# Altium footprint library TarabusLibrary.PcbLib: 591 footprints (part 23 of 37)
Each footprint in its own frame and in the unit in brackets; x right, y up, seen from the top. Pads: shape width x height; smd on the part's side, far side on the other; paste and mask are expansions set on the pad; w line width, h text height; cw(c..) or ccw(c..) is an arc to the next point about the centre after c.
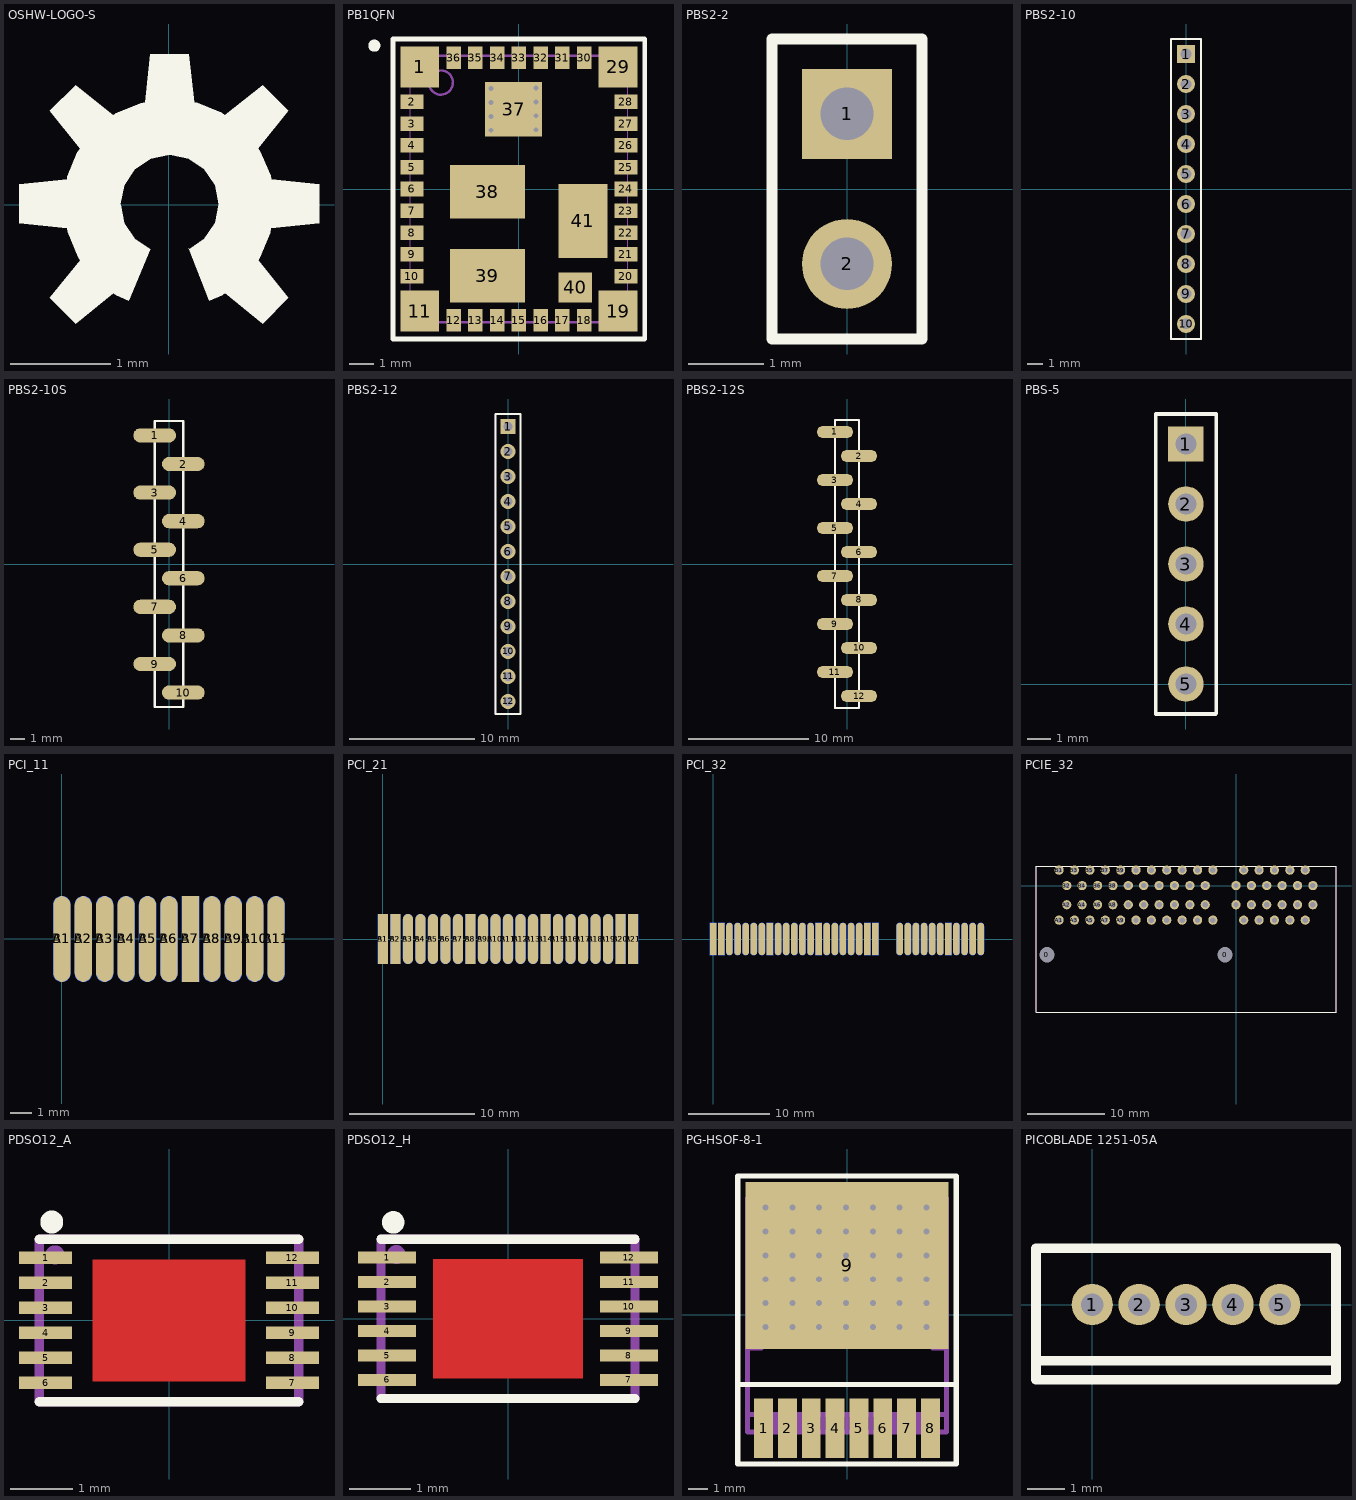
[diagram p22: the footprints below, top view; thin cyan lines are the x and y axes]

## OSHW-LOGO-S [mm] "OSHW-LOGO-S"
Top Overlay:
  region: 0.406,-0.953 0.534,-0.9 0.561,-0.879 0.559,-0.875 0.94,-1.182 1.194,-0.924 0.894,-0.549 0.91,-0.528 1.014,-0.278 1.02,-0.233 1.016,-0.232 1.499,-0.183 1.499,0.203 1.021,0.255 1.016,0.288 0.916,0.531 0.893,0.561 0.889,0.559 1.194,0.94 0.94,1.194 0.561,0.893 0.531,0.916 0.288,1.016 0.255,1.021 0.254,1.016 0.203,1.499 -0.183,1.499 -0.233,1.02 -0.278,1.014 -0.528,0.91 -0.549,0.894 -0.546,0.889 -0.924,1.194 -1.182,0.94 -0.878,0.561 -0.906,0.523 -1.007,0.279 -1.011,0.255 -1.005,0.254 -1.489,0.203 -1.489,-0.183 -1.01,-0.233 -1.005,-0.269 -0.901,-0.52 -0.879,-0.549 -0.875,-0.546 -1.182,-0.924 -0.924,-1.182 -0.549,-0.879 -0.52,-0.901 -0.395,-0.953 -0.183,-0.442 -0.338,-0.338 -0.442,-0.183 -0.478,0 -0.477,0 -0.478,0.008 -0.441,0.195 -0.335,0.354 -0.176,0.461 0.012,0.498 0.199,0.461 0.358,0.354 0.465,0.195 0.502,0.008 0.465,-0.18 0.358,-0.339 0.206,-0.44 0.203,-0.433

## PB1QFN [mm]
height 2.9
pads (41):
  rect 1.6x1.7 smd: 1(-4.1,5.05) 11(-4.1,-5.05) 19(4.1,-5.05) 29(4.1,5.05)
  rect 0.95x0.6 smd: 2(-4.425,3.6) 3(-4.425,2.7) 4(-4.425,1.8) 5(-4.425,0.9) 6(-4.425,0) 7(-4.425,-0.9) 8(-4.425,-1.8) 9(-4.425,-2.7) 10(-4.425,-3.6) 20(4.425,-3.6) 21(4.425,-2.7) 22(4.425,-1.8) 23(4.425,-0.9) 24(4.425,0) 25(4.425,0.9) 26(4.425,1.8) 27(4.425,2.7) 28(4.425,3.6)
  rect 0.6x0.95 smd: 12(-2.7,-5.425) 13(-1.8,-5.425) 14(-0.9,-5.425) 15(0,-5.425) 16(0.9,-5.425) 17(1.8,-5.425) 18(2.7,-5.425) 30(2.7,5.425) 31(1.8,5.425) 32(0.9,5.425) 33(0,5.425) 34(-0.9,5.425) 35(-1.8,5.425) 36(-2.7,5.425)
  rect 2.35x2.25 smd: 37(-0.22,3.3)
  rect 3.1x2.2 smd: 38(-1.3,-0.11) 39(-1.3,-3.59)
  rect 1.4x1.24 smd: 40(2.33,-4.07)
  rect 2.04x3.05 smd: 41(2.65,-1.32)
via -1.15,4.15 diameter 0.5 hole 0.2
via -1.15,3.575 diameter 0.5 hole 0.2
via -1.15,3 diameter 0.5 hole 0.2
via -1.15,2.425 diameter 0.5 hole 0.2
via 0.71,4.175 diameter 0.5 hole 0.2
via 0.71,3.6 diameter 0.5 hole 0.2
via 0.71,3.025 diameter 0.5 hole 0.2
via 0.71,2.45 diameter 0.5 hole 0.2
Top Overlay:
  circle w0.25: c-5.975,5.925 r0.125
  lines w0.2: -5.2,-6.2 -5.2,6.2 5.2,6.2 5.2,-6.2 -5.2,-6.2
Mechanical 7:
  lines w0.05: -4.5,-5.5 4.5,-5.5 4.5,5.5 -4.5,5.5 -4.5,-5.5
Mechanical 9:
  circle w0.1: c-3.225,4.4 r0.5
  lines w0.1: -4.5,-5.5 4.5,-5.5 ; -4.5,5.5 4.5,5.5
Mechanical 10:
  text ".Designator" at 2.25,8 h1
  text ".Comment" at 2.25,7 h1
3D body: height 2.9, standoff 0.05, extent -4.5,-5.5 4.5,5.5

## PBS2-2 [mm]
height 4.5
pads (2):
  rect 1.2x1.2 hole 0.7: 1(0,1)
  round 1.2 hole 0.7: 2(0,-1)
Top Overlay:
  lines w0.15: -1,-2 1,-2 1,2 -1,2 -1,-2
Mechanical 7:
  lines w0.1: -1,-2 1,-2 1,2 -1,2 -1,-2
Mechanical 10:
  text ".Designator" at -0.575,3.15 h0.8
  text ".Comment" at -0.575,2.475 h0.6
3D body: height 4.5, standoff 0, extent -1,-2 1,2

## PBS2-10 [mm]
height 4.5
pads (10):
  rect 1.2x1.2 hole 0.7: 1(0,9)
  round 1.2 hole 0.7: 2(0,7) 3(0,5) 4(0,3) 5(0,1) 6(0,-1) 7(0,-3) 8(0,-5) 9(0,-7) 10(0,-9)
Top Overlay:
  lines w0.15: -1,-10 -1,10 1,10 1,-10 -1,-10
Mechanical 7:
  lines w0.1: -1,-10 1,-10 1,10 -1,10 -1,-10
Mechanical 10:
  text ".Comment" at -0.575,10.475 h0.6
  text ".Designator" at -0.575,11.15 h0.8
3D body: height 4.5, standoff 0, extent -1,-10 1,10

## PBS2-10S [mm]
height 4.5
pads (10):
  oval 3x1 smd: 1(-1,9) 2(1,7) 3(-1,5) 4(1,3) 5(-1,1) 6(1,-1) 7(-1,-3) 8(1,-5) 9(-1,-7) 10(1,-9)
Top Overlay:
  lines w0.15: -1,-10 -1,10 1,10 1,-10 -1,-10
Mechanical 7:
  lines w0.1: -1,-10 1,-10 1,10 -1,10 -1,-10
Mechanical 10:
  text ".Comment" at -0.575,10.475 h0.6
  text ".Designator" at -0.575,11.15 h0.8
3D body: height 4.5, standoff 0, extent -1,-10 1,10

## PBS2-12 [mm]
height 4.5
pads (12):
  rect 1.2x1.2 hole 0.7: 1(0,11)
  round 1.2 hole 0.7: 2(0,9) 3(0,7) 4(0,5) 5(0,3) 6(0,1) 7(0,-1) 8(0,-3) 9(0,-5) 10(0,-7) 11(0,-9) 12(0,-11)
Top Overlay:
  lines w0.15: -1,-12 1,-12 1,12 -1,12 -1,-12
Mechanical 7:
  lines w0.1: -1,-12 1,-12 1,12 -1,12 -1,-12
Mechanical 10:
  text ".Designator" at -0.575,13.15 h0.8
  text ".Comment" at -0.575,12.475 h0.6
3D body: height 4.5, standoff 0, extent -1,-12 1,12

## PBS2-12S [mm]
height 4.5
pads (12):
  oval 3x1 smd: 1(-1,11) 2(1,9) 3(-1,7) 4(1,5) 5(-1,3) 6(1,1) 7(-1,-1) 8(1,-3) 9(-1,-5) 10(1,-7) 11(-1,-9) 12(1,-11)
Top Overlay:
  lines w0.15: -1,-12 1,-12 1,12 -1,12 -1,-12
Mechanical 7:
  lines w0.1: -1,-12 1,-12 1,12 -1,12 -1,-12
Mechanical 10:
  text ".Designator" at -0.575,13.15 h0.8
  text ".Comment" at -0.575,12.475 h0.6
3D body: height 4.5, standoff 0, extent -1,-12 1,12

## PBS-5 [mm]
height 8.4
pads (5):
  rect 1.5x1.5 hole 0.9: 1(0,10.16)
  round 1.5 hole 0.9: 2(0,7.62) 3(0,5.08) 4(0,2.54) 5(0,0)
Top Overlay:
  lines w0.15: -1.27,-1.27 1.27,-1.27 ; -1.27,-1.245 -1.27,11.43 1.275,11.43 1.275,-1.245
Mechanical 7:
  lines w0.1: -1.27,-1.245 -1.27,11.43 1.275,11.43 1.275,-1.245 -1.27,-1.245
Mechanical 10:
  text ".Designator" at 0.73,12.7 h0.8
  text ".Comment" at 0.84,11.97 h0.6
3D body "User Library-RM254_5pin.step": height 6.02, standoff -3.1, extent -1.265,-1.27 1.275,11.43

## PCI_11 [mm]
pads (22):
  oval 0.8x4 smd: A1(0,0) A2(1,0) A3(2,0) A4(3,0) A5(4,0) A6(5,0) A8(7,0) A9(8,0) A10(9,0) A11(10,0)
  rect 0.8x4 smd: A7(6,0)
  oval 0.8x4 smd far side: B1(0,0) B2(1,0) B3(2,0) B4(3,0) B5(4,0) B6(5,0) B8(7,0) B9(8,0) B10(9,0) B11(10,0)
  rect 0.8x4 smd far side: B7(6,0)

## PCI_21 [mm]
pads (42):
  rect 0.8x4 smd: A1(0,0) A2(1,0) A8(7,0) A14(13,0) A20(19,0) A21(20,0)
  oval 0.8x4 smd: A3(2,0) A4(3,0) A5(4,0) A6(5,0) A7(6,0) A9(8,0) A10(9,0) A11(10,0) A12(11,0) A13(12,0) A15(14,0) A16(15,0) A17(16,0) A18(17,0) A19(18,0)
  rect 0.8x4 smd far side: B1(0,0) B2(1,0) B8(7,0) B14(13,0) B20(19,0) B21(20,0)
  oval 0.8x4 smd far side: B3(2,0) B4(3,0) B5(4,0) B6(5,0) B7(6,0) B9(8,0) B10(9,0) B11(10,0) B12(11,0) B13(12,0) B15(14,0) B16(15,0) B17(16,0) B18(17,0) B19(18,0)

## PCI_32 [mm]
pads (64):
  rect 0.8x4 smd: A1(0,0) A2(1,0) A8(7,0) A14(13,0) A20(19,0) A21(20,0) A28(29,0)
  oval 0.8x4 smd: A3(2,0) A4(3,0) A5(4,0) A6(5,0) A7(6,0) A9(8,0) A10(9,0) A11(10,0) A12(11,0) A13(12,0) A15(14,0) A16(15,0) A17(16,0) A18(17,0) A19(18,0) A22(23,0) A23(24,0) A24(25,0) A25(26,0) A26(27,0) A27(28,0) A29(30,0) A30(31,0) A31(32,0) A32(33,0)
  rect 0.8x4 smd far side: B1(0,0) B2(1,0) B8(7,0) B14(13,0) B20(19,0) B21(20,0) B28(29,0)
  oval 0.8x4 smd far side: B3(2,0) B4(3,0) B5(4,0) B6(5,0) B7(6,0) B9(8,0) B10(9,0) B11(10,0) B12(11,0) B13(12,0) B15(14,0) B16(15,0) B17(16,0) B18(17,0) B19(18,0) B22(23,0) B23(24,0) B24(25,0) B25(26,0) B26(27,0) B27(28,0) B29(30,0) B30(31,0) B31(32,0) B32(33,0)

## PCIE_32 [mm]
pads (66):
  round 1.2 hole 2: 0(-24.575,-9) 0(-1.425,-9)
  round 1.2 hole 0.7: A1(-23,-4.5) A2(-22,-2.5) A3(-21,-4.5) A4(-20,-2.5) A5(-19,-4.5) A6(-18,-2.5) A7(-17,-4.5) A8(-16,-2.5) A9(-15,-4.5) A10(-14,-2.5) A11(-13,-4.5) A12(-12,-2.5) A13(-11,-4.5) A14(-10,-2.5) A15(-9,-4.5) A16(-8,-2.5) A17(-7,-4.5) A18(-6,-2.5) A19(-5,-4.5) A20(-4,-2.5) A21(-3,-4.5) A22(0,-2.5) A23(1,-4.5) A24(2,-2.5) A25(3,-4.5) A26(4,-2.5) A27(5,-4.5) A28(6,-2.5) A29(7,-4.5) A30(8,-2.5) A31(9,-4.5) A32(10,-2.5) B1(-23,2) B2(-22,0) B3(-21,2) B4(-20,0) B5(-19,2) B6(-18,0) B7(-17,2) B8(-16,0) B9(-15,2) B10(-14,0) B11(-13,2) B12(-12,0) B13(-11,2) B14(-10,0) B15(-9,2) B16(-8,0) B17(-7,2) B18(-6,0) B19(-5,2) B20(-4,0) B21(-3,2) B22(0,0) B23(1,2) B24(2,0) B25(3,2) B26(4,0) B27(5,2) B28(6,0) B29(7,2) B30(8,0) B31(9,2) B32(10,0)
Top Overlay:
  lines w0.1: -26,-16.5 13,-16.5 13,2.5 -26,2.5 -26,-16.5
Mechanical 7:
  lines w0.1: -26,-16.5 -26,2.5 13,2.5 13,-16.5 -26,-16.5
3D body: height 9.45, standoff 0, extent -26,-16.5 13,-6
3D body: height 8, standoff 0, extent -26,-6 13,2.5

## PDSO12_A [mm]
pads (12):
  rect 0.85x0.2 smd: 1(-1.975,1) 2(-1.975,0.6) 3(-1.975,0.2) 4(-1.975,-0.2) 5(-1.975,-0.6) 6(-1.975,-1) 7(1.975,-1) 8(1.975,-0.6) 9(1.975,-0.2) 10(1.975,0.2) 11(1.975,0.6) 12(1.975,1)
Top Layer:
  rectangle: -1.225,-0.975 1.225,0.975
Top Overlay:
  circle w0.254: c-1.875,1.575 r0.056
  lines w0.15: -2.075,-1.3 2.075,-1.3 ; -2.075,1.3 2.075,1.3
Mechanical 7:
  circle w0.254: c-1.825,1.05 r0.025
  lines w0.15: -2.075,-1.3 2.075,-1.3 2.075,1.3 -2.075,1.3 -2.075,-1.3
Mechanical 10:
  text ".Comment" at 0.525,1.575 h0.6
  text ".Designator" at 0.575,2.1 h0.8
3D body "PDSO12.STEP": height 1, standoff 0, extent -2.075,-1.3 2.075,1.3

## PDSO12_H [mm]
pads (12):
  rect 0.95x0.2 smd: 1(-1.975,1) 2(-1.975,0.6) 3(-1.975,0.2) 4(-1.975,-0.2) 5(-1.975,-0.6) 6(-1.975,-1) 7(1.975,-1) 8(1.975,-0.6) 9(1.975,-0.2) 10(1.975,0.2) 11(1.975,0.6) 12(1.975,1)
Top Layer:
  rectangle: -1.225,-0.975 1.225,0.975
Top Overlay:
  circle w0.254: c-1.875,1.575 r0.056
  lines w0.15: -2.075,-1.3 2.075,-1.3 ; -2.075,1.3 2.075,1.3
Mechanical 7:
  circle w0.254: c-1.825,1.05 r0.025
  lines w0.15: -2.075,-1.3 -2.075,1.3 2.075,1.3 2.075,-1.3 -2.075,-1.3
Mechanical 10:
  text ".Designator" at 0.575,2.1 h0.8
  text ".Comment" at 0.525,1.575 h0.6
3D body "PDSO12.STEP": height 1, standoff 0, extent -2.075,-1.3 2.075,1.3

## PG-HSOF-8-1 [mm]
height 3
pads (9):
  rect 0.95x3 smd mask+0.05: 1(-4.2,-5.7) 2(-3,-5.7) 3(-1.8,-5.7) 4(-0.6,-5.7) 5(0.6,-5.7) 6(1.8,-5.7) 7(3,-5.7) 8(4.2,-5.7)
  rect 10.2x8.4 smd: 9(0,2.5)
via -4.1,5.4 diameter 0.8 hole 0.3
via -2.75,5.4 diameter 0.8 hole 0.3
via -1.4,5.4 diameter 0.8 hole 0.3
via -0.05,5.4 diameter 0.8 hole 0.3
via 1.3,5.4 diameter 0.8 hole 0.3
via 4,5.4 diameter 0.8 hole 0.3
via 4,4.2 diameter 0.8 hole 0.3
via 1.3,4.2 diameter 0.8 hole 0.3
via -0.05,4.2 diameter 0.8 hole 0.3
via -1.4,4.2 diameter 0.8 hole 0.3
via -2.75,4.2 diameter 0.8 hole 0.3
via -4.1,4.2 diameter 0.8 hole 0.3
via 4,3 diameter 0.8 hole 0.3
via 1.3,3 diameter 0.8 hole 0.3
via -0.05,3 diameter 0.8 hole 0.3
via -1.4,3 diameter 0.8 hole 0.3
via -2.75,3 diameter 0.8 hole 0.3
via -4.1,3 diameter 0.8 hole 0.3
via 4,1.8 diameter 0.8 hole 0.3
via 1.3,1.8 diameter 0.8 hole 0.3
via -0.05,1.8 diameter 0.8 hole 0.3
via -1.4,1.8 diameter 0.8 hole 0.3
via -2.75,1.8 diameter 0.8 hole 0.3
via -4.1,1.8 diameter 0.8 hole 0.3
via 4,-0.6 diameter 0.8 hole 0.3
via 1.3,-0.6 diameter 0.8 hole 0.3
via -0.05,-0.6 diameter 0.8 hole 0.3
via -1.4,-0.6 diameter 0.8 hole 0.3
via -2.75,-0.6 diameter 0.8 hole 0.3
via 2.65,-0.6 diameter 0.8 hole 0.3
via 2.65,1.8 diameter 0.8 hole 0.3
via 2.65,3 diameter 0.8 hole 0.3
via 2.65,4.2 diameter 0.8 hole 0.3
via 2.65,5.4 diameter 0.8 hole 0.3
via 2.65,0.6 diameter 0.8 hole 0.3
via -4.1,0.6 diameter 0.8 hole 0.3
via -2.75,0.6 diameter 0.8 hole 0.3
via -1.4,0.6 diameter 0.8 hole 0.3
via -0.05,0.6 diameter 0.8 hole 0.3
via 1.3,0.6 diameter 0.8 hole 0.3
via 4,0.6 diameter 0.8 hole 0.3
via -4.1,-0.6 diameter 0.8 hole 0.3
Top Overlay:
  lines w0.254: -5.5,-3.5 5.5,-3.5 ; -5.5,-7.5 -5.5,7 5.5,7 5.5,-7.5 -5.5,-7.5
Mechanical 7:
  lines w0.254: -5,-5 5,-5 ; -5,5 5,5 ; -3.6,-5.9 -3.6,-5 ; -2.4,-5.9 -2.4,-5 ; -1.2,-5.9 -1.2,-5 ; 0,-5.9 0,-5 ; 1.2,-5.9 1.2,-5 ; 2.4,-5.9 2.4,-5 ; 3.6,-5.9 3.6,-5 ; -5,-5.9 5,-5.9 5,5.9 -5,5.9 -5,-5.9
Mechanical 9:
  lines w0.254: -5,-5 5,-5 ; -5,1.7 -5,1.65 -4.3,1.65 -4.3,-1.65 -4.9,-1.65 ; -5,5 5,5 ; 5,-1.7 5,-1.65 4.3,-1.65 4.3,1.65 5,1.65 5,1.7 ; -5,-5.9 -5,5.9 5,5.9 5,-5.9 -5,-5.9
3D body: height 3, standoff 0.05, extent -5,-5 5,5
3D body: height 1, standoff 0.05, extent -5,5 5,5.9
3D body: height 1, standoff 0.05, extent 3.8,-5.85 4.6,-4.95
3D body: height 1, standoff 0.05, extent 2.6,-5.85 3.4,-4.95
3D body: height 1, standoff 0.05, extent 1.4,-5.85 2.2,-4.95
3D body: height 1, standoff 0.05, extent 0.2,-5.85 1,-4.95
3D body: height 1, standoff 0.05, extent -1,-5.85 -0.2,-4.95
3D body: height 1, standoff 0.05, extent -2.2,-5.85 -1.4,-4.95
3D body: height 1, standoff 0.05, extent -3.4,-5.85 -2.6,-4.95
3D body: height 1, standoff 0.05, extent -4.6,-5.85 -3.8,-4.95
3D body: height 1, standoff 0.05, extent 4.3,-1.625 5,1.625
3D body: height 1, standoff 0.05, extent -5,-1.625 -4.3,1.625

## PICOBLADE 1251-05A [mm]
pads (5):
  round 1.1 hole 0.6 mask+0: 1(0,0) 2(1.25,0) 3(2.5,0) 4(3.75,0) 5(5,0)
Top Overlay:
  lines w0.254: -1.5,-1.5 6.5,-1.5 ; -1.5,-2 6.5,-2 6.5,1.5 -1.5,1.5 -1.5,-2